# Altium footprint library Miscellaneous Devices LC.PcbLib: 776 footprints (part 27 of 49)
Each footprint in its own frame and in the unit in brackets; x right, y up, seen from the top. Pads: shape width x height; smd on the part's side, far side on the other; paste and mask are expansions set on the pad; w line width, h text height; cw(c..) or ccw(c..) is an arc to the next point about the centre after c.
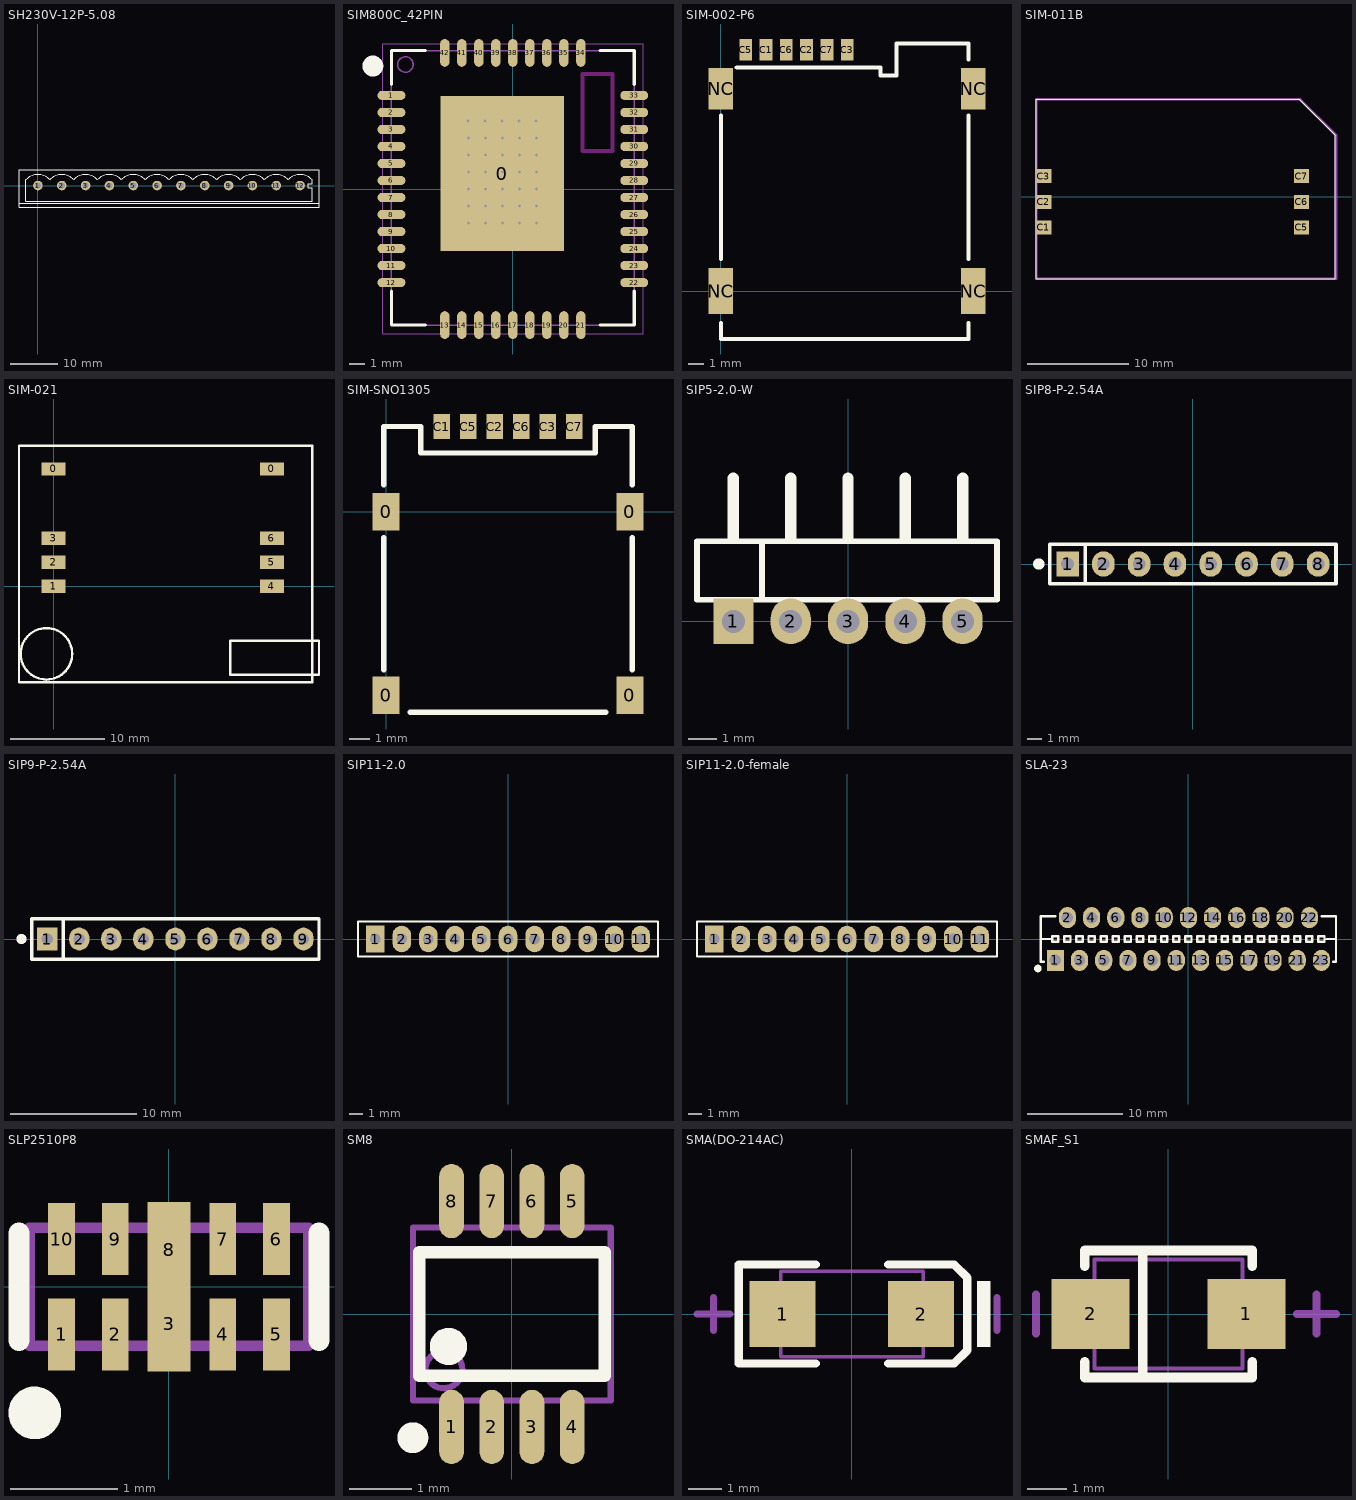
[diagram p26: the footprints below, top view; thin cyan lines are the x and y axes]

## SH230V-12P-5.08 [mil]
height 60
pads (12):
  round 80 hole 52: 1(0,0) 2(200,0) 3(400,0) 4(600,0) 5(800,0) 6(1000,0) 7(1200,0) 8(1400,0) 9(1600,0) 10(1800,0) 11(2000,0) 12(2200,0)
Top Overlay:
  lines w8: -100.96,50.17 cw(c-0.79,-50) 99.39,50.17 ; 99.04,50.17 cw(c199.21,-50) 299.39,50.17 ; 299.04,50.17 cw(c399.21,-50) 499.39,50.17 ; 499.04,50.17 cw(c599.21,-50) 699.39,50.17 ; 699.04,50.17 cw(c799.21,-50) 899.39,50.17 ; 899.04,50.17 cw(c999.21,-50) 1099.39,50.17 ; 1099.04,50.17 cw(c1199.21,-50) 1299.39,50.17 ; 1299.04,50.17 cw(c1399.21,-50) 1499.39,50.17 ; 1499.04,50.17 cw(c1599.21,-50) 1699.39,50.17 ; 1699.04,50.17 cw(c1799.21,-50) 1899.39,50.17 ; 1899.04,50.17 cw(c1999.21,-50) 2099.39,50.17 ; 2099.83,50.17 cw(c2200,-50) 2300.17,50.17
  lines w10: -159.12,-150 2358.33,-150 ; -100.79,50 -100.79,-133.33 2300,-133.33 2300,-16.67 2266.67,-16.67 2266.67,16.67 2300,16.67 2300,50 ; -159.12,-180.31 2358.33,-180.31 2358.33,133.33 -159.12,133.33 -159.12,-180.31

## SIM800C_42PIN [mm] "SIM800C"
pads (43):
  rect 8x10 smd: 0(-0.675,1)
  oval 1.8x0.6 smd: 1(-7.85,6.05) 2(-7.85,4.95) 3(-7.85,3.85) 4(-7.85,2.75) 5(-7.85,1.65) 6(-7.85,0.55) 7(-7.85,-0.55) 8(-7.85,-1.65) 9(-7.85,-2.75) 10(-7.85,-3.85) 11(-7.85,-4.95) 12(-7.85,-6.05) 22(7.85,-6.05) 23(7.85,-4.95) 24(7.85,-3.85) 25(7.85,-2.75) 26(7.85,-1.65) 27(7.85,-0.55) 28(7.85,0.55) 29(7.85,1.65) 30(7.85,2.75) 31(7.85,3.85) 32(7.85,4.95) 33(7.85,6.05)
  oval 0.6x1.8 smd: 13(-4.4,-8.8) 14(-3.3,-8.8) 15(-2.2,-8.8) 16(-1.1,-8.8) 17(0,-8.8) 18(1.1,-8.8) 19(2.2,-8.8) 20(3.3,-8.8) 21(4.4,-8.8) 34(4.4,8.8) 35(3.3,8.8) 36(2.2,8.8) 37(1.1,8.8) 38(0,8.8) 39(-1.1,8.8) 40(-2.2,8.8) 41(-3.3,8.8) 42(-4.4,8.8)
via -2.875,3.3 diameter 0.5 hole 0.2
via -1.775,3.3 diameter 0.5 hole 0.2
via -0.675,3.3 diameter 0.5 hole 0.2
via 0.425,3.3 diameter 0.5 hole 0.2
via 1.525,3.3 diameter 0.5 hole 0.2
via -2.875,2.2 diameter 0.5 hole 0.2
via -1.775,2.2 diameter 0.5 hole 0.2
via -0.675,2.2 diameter 0.5 hole 0.2
via 0.425,2.2 diameter 0.5 hole 0.2
via 1.525,2.2 diameter 0.5 hole 0.2
via -2.875,1.1 diameter 0.5 hole 0.2
via -1.775,1.1 diameter 0.5 hole 0.2
via -0.675,1.1 diameter 0.5 hole 0.2
via 0.425,1.1 diameter 0.5 hole 0.2
via 1.525,1.1 diameter 0.5 hole 0.2
via -2.875,0 diameter 0.5 hole 0.2
via -1.775,0 diameter 0.5 hole 0.2
via -0.675,0 diameter 0.5 hole 0.2
via 0.425,0 diameter 0.5 hole 0.2
via 1.525,0 diameter 0.5 hole 0.2
via -2.875,-1.1 diameter 0.5 hole 0.2
via -1.775,-1.1 diameter 0.5 hole 0.2
via -0.675,-1.1 diameter 0.5 hole 0.2
via 0.425,-1.1 diameter 0.5 hole 0.2
via 1.525,-1.1 diameter 0.5 hole 0.2
via -2.875,-2.2 diameter 0.5 hole 0.2
via -1.775,-2.2 diameter 0.5 hole 0.2
via -0.675,-2.2 diameter 0.5 hole 0.2
via 0.425,-2.2 diameter 0.5 hole 0.2
via 1.525,-2.2 diameter 0.5 hole 0.2
via 1.5,4.4 diameter 0.5 hole 0.2
via 0.4,4.4 diameter 0.5 hole 0.2
via -0.7,4.4 diameter 0.5 hole 0.2
via -1.8,4.4 diameter 0.5 hole 0.2
via -2.9,4.4 diameter 0.5 hole 0.2
Top Overlay:
  circle w0.7: c-9.05,7.95 r0.325
  lines w0.2: -7.85,-6.6 -7.85,-8.8 -5.65,-8.8 ; -7.85,6.75 -7.85,8.95 -5.65,8.95 ; 5.65,-8.8 7.85,-8.8 7.85,-6.6 ; 5.65,8.95 7.85,8.95 7.85,6.75
Keep-Out Layer:
  lines w0.254: 4.5,2.45 6.45,2.45 6.45,7.43 4.5,7.43 4.5,2.45
Mechanical 13:
  circle w0.1: c-6.95,8.05 r0.5
  lines w0.1: -7.85,-8.8 -7.85,8.95 7.85,8.95 7.85,-8.8 -7.85,-8.8
Mechanical 15:
  lines w0.05: -8.425,-9.35 -8.425,9.4 8.425,9.4 8.425,-9.35 -8.425,-9.35
3D body: height 2.3, standoff 0.08, extent -7.85,-8.65 7.85,8.95

## SIM-002-P6 [mm] "sim卡座"
pads (10):
  rect 0.8x1.35 smd: C1(2.83,15.105) C2(5.37,15.105) C3(7.91,15.105) C5(1.56,15.105) C6(4.1,15.105) C7(6.64,15.105)
  rect 1.55x2.9 smd: NC(0,0) NC(15.8,0)
  rect 1.55x2.6 smd: NC(0,12.68) NC(15.8,12.68)
Top Overlay:
  lines w0.254: 0,-2 0,-3 15.5,-3 15.5,-2 ; 0,2 0,11 ; 1,14 10,14 10,13.5 11,13.5 11,14 11,15.5 15.5,15.5 15.5,14.5 ; 15.5,2 15.5,11

## SIM-011B [mm] "SIM卡座"
pads (6):
  rect 1.5x1.4 smd mask+0.05: C1(-41.275,-3.048) C2(-41.275,-0.508) C3(-41.275,2.032) C5(-15.735,-3.048) C6(-15.735,-0.508) C7(-15.735,2.032)
Top Overlay:
  lines w0.1: -42.058,-8.128 -12.416,-8.128 -12.416,6.096 -15.972,9.652 -42.058,9.652 -42.058,-8.128
Mechanical 1:
  lines w0.25: -42.037,-8.128 -12.319,-8.128 -12.319,6.096 -15.875,9.652 -42.037,9.652 -42.037,-8.128

## SIM-021 [mm] "sim卡座"
pads (8):
  rect 2.5x1.4 smd: 0(0,12.4) 0(23.1,12.4) 1(0,0) 2(0,2.54) 3(0,5.08) 4(23.1,0) 5(23.1,2.54) 6(23.1,5.08)
Top Overlay:
  circle w0.254: c-0.75,-7.15 r2.723
  lines w0.254: 27.35,14.85 27.35,-10.15 -3.65,-10.15 -3.65,14.85 27.35,14.85 ; 27.35,14.85 27.35,14.85 ; 18.7,-9.35 18.7,-5.75 28.075,-5.75 28.075,-9.35 18.7,-9.35

## SIM-SNO1305 [mm] "sim卡座"
pads (10):
  rect 1.3x1.8 smd: 0(0,-8.8) 0(0,0) 0(11.7,-8.8) 0(11.7,0)
  rect 0.8x1.2 smd: C1(2.675,4.1) C2(5.215,4.1) C3(7.755,4.1) C5(3.945,4.1) C6(6.485,4.1) C7(9.025,4.1)
Top Overlay:
  lines w0.254: -0.119,-7.584 -0.119,-1.234 ; -0.119,1.306 -0.119,4.1 1.659,4.1 1.659,2.83 10.041,2.83 10.041,4.1 11.819,4.1 11.819,1.306 ; 1.151,-9.616 10.549,-9.616 ; 11.819,-7.584 11.819,-1.234
3D body "SNO-1305-B.STEP": height 1.45, standoff 0.05, extent -0.409,-9.579 11.991,4.521

## SIP5-2.0-W [mm]
pads (5):
  rect 1.4x1.6 hole 0.8: 1(-4,0)
  oval 1.4x1.6 hole 0.8: 2(-2,0) 3(0,0) 4(2,0) 5(4,0)
Top Overlay:
  lines w0.2: -3,0.75 -3,2.79 ; 5.2,0.75 -5.27,0.75 -5.27,2.79 5.2,2.79 5.2,0.755
  lines w0.4: -4,2.895 -4,5 ; -2,2.895 -2,5 ; 0,2.895 0,5 ; 2,2.895 2,5 ; 4,2.895 4,5
Bottom Overlay:
  lines w0.5: -3,-1 -3,1 ; -1,-1 -1,1 ; 1,-1 1,1 ; 3,-1 3,1
3D body "pin_header_a-sl200-ea-g05d.stp": height 2, standoff -2.8, extent -4.953,-0.323 4.997,6.927

## SIP8-P-2.54A [mm]
pads (8):
  rect 1.6x1.8 hole 0.9: 1(-8.89,0)
  oval 1.6x1.8 hole 0.9: 2(-6.35,0) 3(-3.81,0) 4(-1.27,0) 5(1.27,0) 6(3.81,0) 7(6.35,0) 8(8.89,0)
Top Overlay:
  circle w0.4: c-10.93,0 r0.2
  lines w0.254: -7.62,-1.4 -7.62,1.4 ; -10.16,-1.4 -10.16,1.4 10.16,1.4 10.16,-1.4 -10.16,-1.4

## SIP9-P-2.54A [mm]
pads (9):
  rect 1.6x1.8 hole 0.9: 1(-10.16,0)
  oval 1.6x1.8 hole 0.9: 2(-7.62,0) 3(-5.08,0) 4(-2.54,0) 5(0,0) 6(2.54,0) 7(5.08,0) 8(7.62,0) 9(10.16,0)
Top Overlay:
  circle w0.4: c-12.2,0 r0.2
  lines w0.254: -8.89,-1.4 -8.89,1.4 ; -11.39,-1.6 11.39,-1.6 11.39,1.6 -11.39,1.6 -11.39,-1.6

## SIP11-2.0 [mm]
pads (11):
  rect 1.4x2 hole 0.8: 1(-10,0)
  oval 1.4x2 hole 0.8: 2(-8,0) 3(-6,0) 4(-4,0) 5(-2,0) 6(0,0) 7(2,0) 8(4,0) 9(6,0) 10(8,0) 11(10,0)
Top Overlay:
  lines w0.15: -11.3,-1.3 -11.3,1.3 11.3,1.3 11.3,-1.3 -11.3,-1.3
Bottom Overlay:
  lines w0.5: -9,-1 -9,1 ; -7,-1 -7,1 ; -5,-1 -5,1 ; -3,-1 -3,1 ; -1,-1 -1,1 ; 1,-1 1,1 ; 3,-1 3,1 ; 5,-1 5,1 ; 7,-1 7,1 ; 9,-1 9,1
3D body "pin_header_a-sl200-eg-g11d.stp": height 6, standoff -2.8, extent -11.049,-0.889 10.901,1.111

## SIP11-2.0-female [mm]
pads (11):
  rect 1.4x2 hole 0.8: 1(-10,0)
  oval 1.4x2 hole 0.8: 2(-8,0) 3(-6,0) 4(-4,0) 5(-2,0) 6(0,0) 7(2,0) 8(4,0) 9(6,0) 10(8,0) 11(10,0)
Top Overlay:
  lines w0.15: -11.3,-1.3 11.3,-1.3 11.3,1.3 -11.3,1.3 -11.3,-1.3
Bottom Overlay:
  lines w0.5: -9,-1 -9,1 ; -7,-1 -7,1 ; -5,-1 -5,1 ; -3,-1 -3,1 ; -1,-1 -1,1 ; 1,-1 1,1 ; 3,-1 3,1 ; 5,-1 5,1 ; 7,-1 7,1 ; 9,-1 9,1
3D body "female_header_a-bl200-eg-g11d.stp": height 4, standoff -2.8, extent -11.176,-1.25 11.324,1.25

## SLA-23 [mm]
pads (23):
  rect 1.8x2.2 hole 1.2: 1(-13.97,-2.25)
  oval 1.8x2.2 hole 1.2: 2(-12.7,2.25) 3(-11.43,-2.25) 4(-10.16,2.25) 5(-8.89,-2.25) 6(-7.62,2.25) 7(-6.35,-2.25) 8(-5.08,2.25) 9(-3.81,-2.25) 10(-2.54,2.25) 11(-1.27,-2.25) 12(0,2.25) 13(1.27,-2.25) 14(2.54,2.25) 15(3.81,-2.25) 16(5.08,2.25) 17(6.35,-2.25) 18(7.62,2.25) 19(8.89,-2.25) 20(10.16,2.25) 21(11.43,-2.25) 22(12.7,2.25) 23(13.97,-2.25)
Top Overlay:
  circle w0.4: c-15.8,-3.1 r0.2
  lines w0.254: -15.5,0 -14.5,0 ; -15.2,-2.4 -15.5,-2.4 -15.5,2.4 -14,2.4 ; 14,2.4 15.5,2.4 15.5,-2.4 15.2,-2.4 ; 14.5,0 15.5,0 ; -14.295,-0.275 -14.295,0.275 -13.645,0.275 -13.645,-0.275 -14.295,-0.275 ; -13.025,-0.275 -12.375,-0.275 -12.375,0.275 -13.025,0.275 -13.025,-0.275 ; -11.755,-0.275 -11.755,0.275 -11.105,0.275 -11.105,-0.275 -11.755,-0.275 ; -10.485,-0.275 -9.835,-0.275 -9.835,0.275 -10.485,0.275 -10.485,-0.275 ; -9.215,-0.275 -9.215,0.275 -8.565,0.275 -8.565,-0.275 -9.215,-0.275 ; -7.945,-0.275 -7.295,-0.275 -7.295,0.275 -7.945,0.275 -7.945,-0.275 ; -6.675,-0.275 -6.675,0.275 -6.025,0.275 -6.025,-0.275 -6.675,-0.275 ; -5.405,-0.275 -4.755,-0.275 -4.755,0.275 -5.405,0.275 -5.405,-0.275 ; -4.135,-0.275 -4.135,0.275 -3.485,0.275 -3.485,-0.275 -4.135,-0.275 ; -2.865,-0.275 -2.215,-0.275 -2.215,0.275 -2.865,0.275 -2.865,-0.275 ; -1.595,-0.275 -0.945,-0.275 -0.945,0.275 -1.595,0.275 -1.595,-0.275 ; -0.325,-0.275 -0.325,0.275 0.325,0.275 0.325,-0.275 -0.325,-0.275 ; 0.945,-0.275 0.945,0.275 1.595,0.275 1.595,-0.275 0.945,-0.275 ; 2.215,-0.275 2.215,0.275 2.865,0.275 2.865,-0.275 2.215,-0.275 ; 3.485,-0.275 4.135,-0.275 4.135,0.275 3.485,0.275 3.485,-0.275 ; 4.755,-0.275 4.755,0.275 5.405,0.275 5.405,-0.275 4.755,-0.275 ; 6.025,-0.275 6.675,-0.275 6.675,0.275 6.025,0.275 6.025,-0.275 ; 7.295,-0.275 7.295,0.275 7.945,0.275 7.945,-0.275 7.295,-0.275 ; 8.565,-0.275 9.215,-0.275 9.215,0.275 8.565,0.275 8.565,-0.275 ; 9.835,-0.275 9.835,0.275 10.485,0.275 10.485,-0.275 9.835,-0.275 ; 11.105,-0.275 11.755,-0.275 11.755,0.275 11.105,0.275 11.105,-0.275 ; 12.375,-0.275 12.375,0.275 13.025,0.275 13.025,-0.275 12.375,-0.275 ; 13.645,-0.275 13.645,0.275 14.295,0.275 14.295,-0.275 13.645,-0.275

## SLP2510P8 [mm]
pads (10):
  rect 0.25x0.67 smd mask+0.051: 1(-1,-0.445) 2(-0.5,-0.445) 4(0.5,-0.445) 5(1,-0.445) 6(1,0.445) 7(0.5,0.445) 9(-0.5,0.445) 10(-1,0.445)
  rect 0.4x0.889 smd mask+0.051: 3(0,-0.343) 8(0,0.343)
Top Overlay:
  circle w0.25: c-1.25,-1.175 r0.12
  lines w0.2: -1.397,-0.5 -1.397,0.5 ; 1.397,-0.5 1.397,0.5
Mechanical 13:
  lines w0.1: -1.3,-0.55 -1.3,0.55 1.3,0.55 1.3,-0.55 -1.3,-0.55

## SM8 [mm]
pads (8):
  oval 0.4x1.2 smd mask+0.051: 1(-0.975,-1.825) 2(-0.325,-1.825) 3(0.325,-1.825) 4(0.975,-1.825) 5(0.975,1.825) 6(0.325,1.825) 7(-0.325,1.825) 8(-0.975,1.825)
Top Overlay:
  circle w0.3: c-1.025,-0.525 r0.15
  circle w0.25: c-1.6,-2 r0.125
  lines w0.2: -1.5,-1 1.5,-1 1.5,1 -1.5,1 -1.5,-1
Mechanical 13:
  circle w0.1: c-1.1,-0.9 r0.3
  lines w0.1: -1.6,-1.4 -1.6,1.4 1.6,1.4 1.6,-1.4 -1.6,-1.4

## SMA(DO-214AC) [mm]
pads (2):
  rect 2x2 smd: 1(-2.1,0) 2(2.1,0)
Top Overlay:
  region: 4.2,1 3.8,1 3.8,-1 4.2,-1
  lines w0.254: -1.1,-1.5 -3.431,-1.5 -3.431,1.5 -1.1,1.5 ; 1.1,-1.5 3.1,-1.5 3.5,-1.1 3.5,1.1 3.1,1.5 1.1,1.5
Mechanical 13:
  lines w0.1: -2.16,-1.3 -2.16,1.3 2.16,1.3 2.16,-1.3 -2.16,-1.3
Mechanical 15:
  lines w0.203: -4.7,0 -3.7,0 ; -4.2,-0.5 -4.2,0.5 ; 4.4,-0.5 4.4,0.5
3D body "DO-214AC.STEP": height 2.4, standoff 0, extent -2.3,-1.25 2.3,1.45

## SMAF_S1 [mm]
pads (2):
  rect 2x1.8 smd: 1(2,0) 2(-2,0)
Top Overlay:
  lines w0.254: -2.15,-1.23 -2.15,-1.625 2.15,-1.625 2.15,-1.23 ; -2.15,1.23 -2.15,1.625 2.15,1.625 2.15,1.23 ; -0.66,-1.625 -0.66,1.625
Mechanical 13:
  lines w0.1: -1.9,-1.4 1.9,-1.4 1.9,1.4 -1.9,1.4 -1.9,-1.4
Mechanical 15:
  lines w0.203: -3.4,-0.5 -3.4,0.5 ; 3.3,0 4.3,0 ; 3.8,-0.5 3.8,0.5